# Altium footprint library CON.PcbLib: 36 footprints (part 1 of 3)
Each footprint in its own frame and in the unit in brackets; x right, y up, seen from the top. Pads: shape width x height; smd on the part's side, far side on the other; paste and mask are expansions set on the pad; w line width, h text height; cw(c..) or ccw(c..) is an arc to the next point about the centre after c.
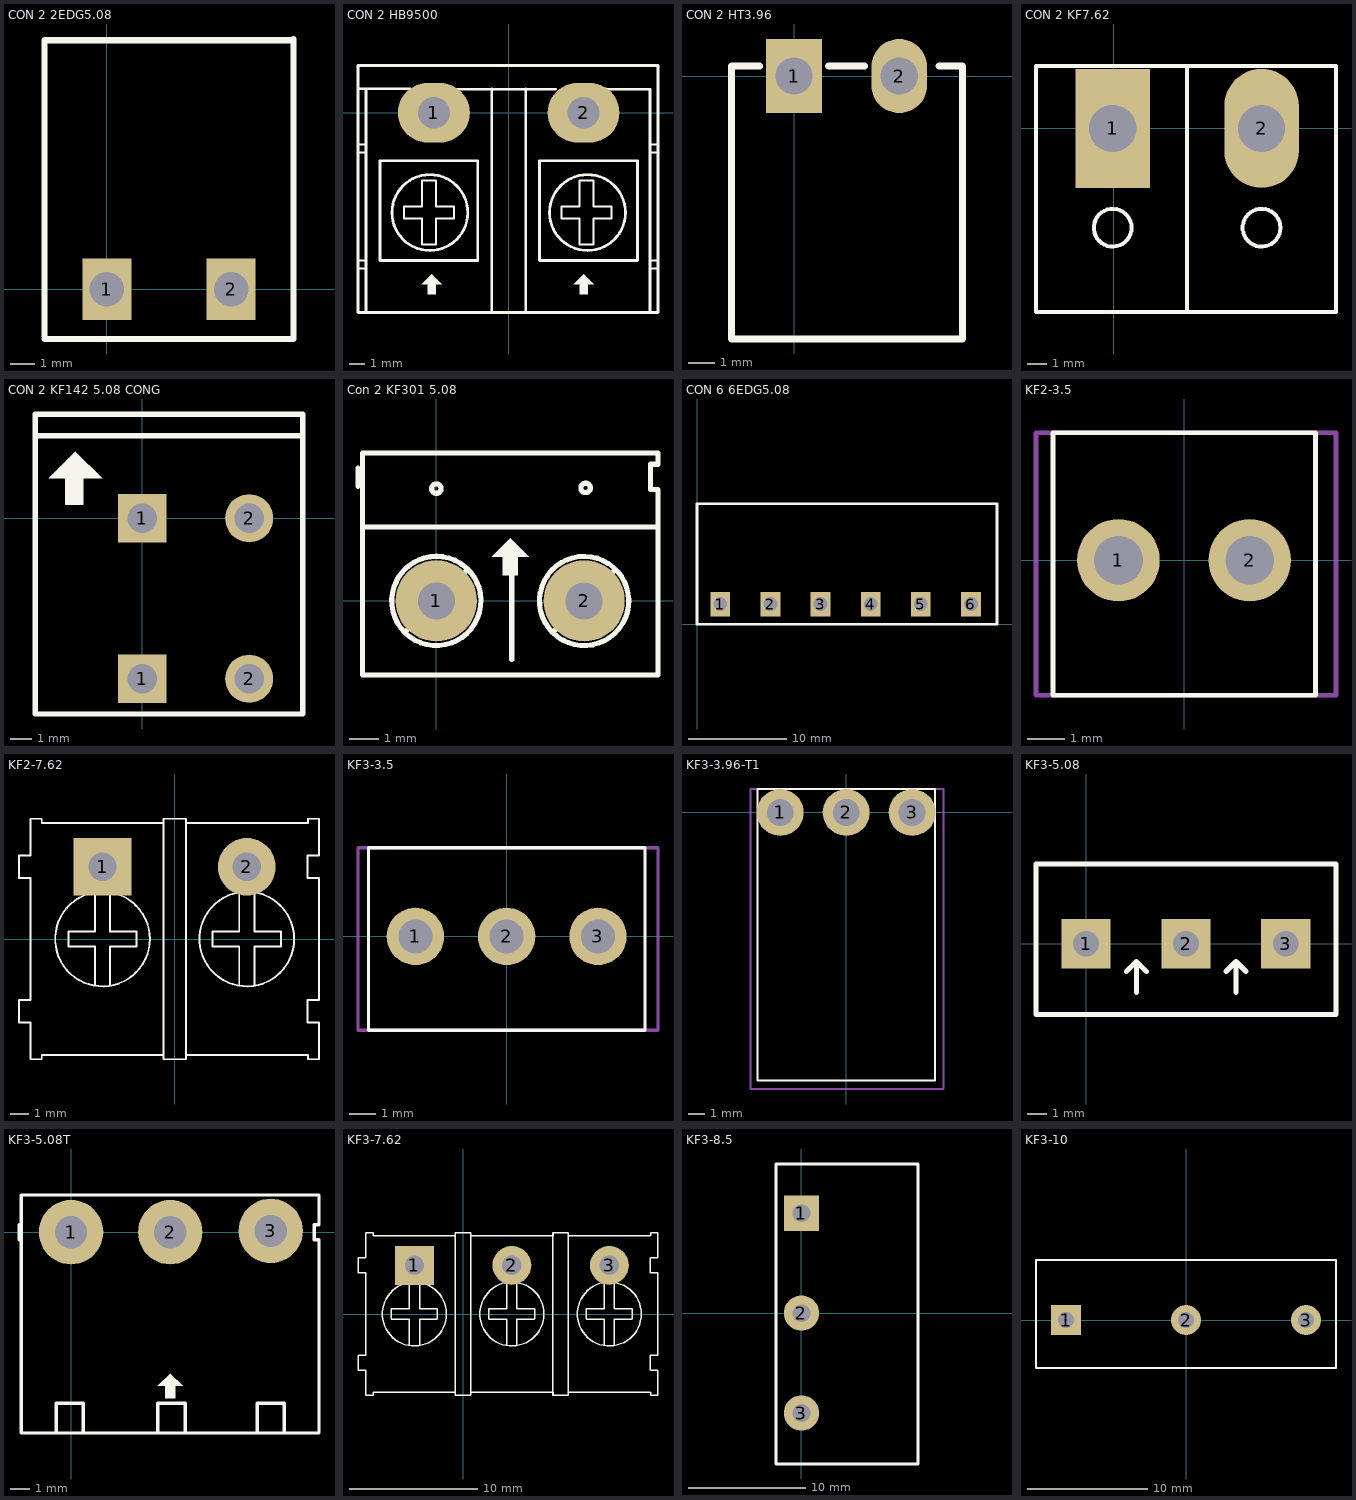
[diagram p0: the footprints below, top view; thin cyan lines are the x and y axes]

## CON 2 2EDG5.08 [mm]
pads (2):
  rect 2x2.5 hole 1.4: 1(0,0) 2(5.08,0)
Top Overlay:
  lines w0.254: -2.54,-2.032 7.62,-2.032 7.62,10.211 ; -2.54,-1.905 -2.54,10.173 ; -2.54,10.16 7.62,10.16
3D body "User Library-BigHeader 5EHDR_1P.step": height 3.15, standoff -9.32, extent -2.5,-1.75 2.5,10.25
3D body "User Library-BigHeader 5EHDR_1P.step": height 3.15, standoff -9.32, extent 2.58,-1.75 7.58,10.25

## CON 2 HB9500 [mil] "Header 2: 300V-20A, 2 pin, hight 300mil, Pin to Pin 400, Colour Green"
height 300
pads (2):
  oval 180x150 hole 80: 1(-187.5,0) 2(187.5,0)
Top Overlay:
  circle w7: c197.5,-250 r95
  circle w7: c-197.5,-250 r95
  region: 187.5,-405 162.5,-430 177.5,-430 177.5,-455 197.5,-455 197.5,-430 212.5,-430
  region: -192.5,-405 -217.5,-430 -202.5,-430 -202.5,-455 -182.5,-455 -182.5,-430 -167.5,-430
  lines w5: -375,-390 -360,-390 ; -375,-370 -360,-370 ; -375,-100 -360,-100 ; -375,-80 -360,-80 ; 355,-390 370,-390 ; 355,-370 370,-370 ; 355,-100 370,-100 ; 355,-80 370,-80 ; -262.5,-265 -262.5,-235 -217.5,-235 -217.5,-170 -182.5,-170 -182.5,-235 -137.5,-235 -137.5,-265 -182.5,-265 -182.5,-330 -217.5,-330 -217.5,-265 -262.5,-265 ; 132.5,-265 132.5,-235 177.5,-235 177.5,-170 212.5,-170 212.5,-235 257.5,-235 257.5,-265 212.5,-265 212.5,-330 177.5,-330 177.5,-265 132.5,-265
  lines w7: -377.5,60 -247.5,60 ; -357.5,-495 -357.5,60 ; -131.89,59.06 118.11,59.06 ; -42.5,-495 -42.5,60 ; 42.5,-495 42.5,60 ; 242.5,60 242.5,59.13 354.33,59.04 354.33,-495 ; -377.5,-500 -377.5,118.11 374.02,118.11 374.02,-500 -377.5,-500 ; -322.5,-370 -77.5,-370 -77.5,-120 -322.5,-120 -322.5,-370 ; 77.5,-370 322.5,-370 322.5,-120 77.5,-120 77.5,-370
3D body "CON 2 HB.stp": height 500.6, standoff -199.4, extent -366,-485 345,115

## CON 2 HT3.96 [mm]
pads (2):
  rect 2.1x2.794 hole 1.4: 1(0,0)
  oval 2.1x2.794 hole 1.4: 2(3.96,0)
Top Overlay:
  lines w0.254: -1.295,0.381 -2.286,0.381 -2.362,0.381 -2.362,-9.906 6.35,-9.906 6.35,0.381 5.461,0.381 ; 1.295,0.381 2.667,0.381
3D body "Con 2 KF396.stp": height 7.02, standoff 0.02, extent -1.968,-10 6.032,0

## CON 2 KF7.62 [mil]
pads (2):
  rect 150x240 hole 95: 1(-2,0)
  oval 150x240 hole 95: 2(298,0)
Top Overlay:
  circle w8: c298,-200 r38.08
  circle w8: c-2,-200 r38.08
  lines w7.87: 148,-368.06 148,126 ; -156.54,-370 448,-370 448,126 -156.54,126 -156.54,-339.27 -156.54,-370
3D body "Con 2 KF7.62.step": height 492.61, standoff -245.58, extent -152,-370 448,122.12

## CON 2 KF142 5.08 CONG [mil]
pads (4):
  rect 90x90 hole 55.12: 1(0,-300.39) 1(0,0)
  round 90 hole 55.12: 2(200,-300.39) 2(200,0)
Top Overlay:
  rectangle: -145,24.61 -110,74.61
  region: -175,74.61 -125,124.61 -75,74.61
  lines w10: -200,64.61 -200,154.61 ; -200,65.61 -200,-366.39 300,-366.39 ; 300,-365 300,195 ; 300,154.61 -200,154.61 ; 300,194.61 -200,194.61 -200,154.61
3D body "Terminal Blocks Fixed SPRING 2PIN CONG.stp": height 520.69, standoff -137.32, extent -205,-375.35 293.43,185.35

## Con 2 KF301 5.08 [mil]
pads (2):
  round 110 hole 50: 1(0,0) 2(200,0)
Top Overlay:
  circle w7: c202,153 r6.4
  circle w7: c0,152 r6.4
  region: 100,85 75,60 90,60 90,35 110,35 110,60 125,60
  lines w7: -106,155 -106,180 ; -100,100 300,100 ; -42,-42 43,43 ; 39.04,46.05 ccw(c0,0) 45.18,40.05 ; 102,-79 102,72 ; 158,-42 242.5,42.5 ; 239.76,45.44 ccw(c200,0) 245.18,40.05 ; 290,182 290,151 300,151 300,-100 -100,-100 -100,50 -100,200 300,200 300,185 290,185 ; 300,-79 300,40
3D body "Con 2 KF301.stp": height 335.25, standoff -137.19, extent -45,-97.4 255,190

## CON 6 6EDG5.08 [mm]
pads (6):
  rect 2x2.5 hole 1.4: 1(2.362,2.057) 2(7.442,2.057) 3(12.522,2.057) 4(17.602,2.057) 5(22.682,2.057) 6(27.762,2.057)
Top Overlay:
  lines w0.254: 16.205,12.217 30.404,12.217 30.404,0.025 30.302,0.025 20.142,0.025 9.982,0.025 0,0.025 0,12.217 20.142,12.217
3D body "User Library-BigHeader 5EHDR_1P.step": height 3.15, standoff -9.32, extent 25.262,0.308 30.262,12.308
3D body "User Library-BigHeader 5EHDR_1P.step": height 3.15, standoff -9.32, extent 20.182,0.308 25.182,12.308
3D body "User Library-BigHeader 5EHDR_1P.step": height 3.15, standoff -9.32, extent 15.102,0.308 20.102,12.308
3D body "User Library-BigHeader 5EHDR_1P.step": height 3.15, standoff -9.32, extent 10.022,0.308 15.022,12.308
3D body "User Library-BigHeader 5EHDR_1P.step": height 3.15, standoff -9.32, extent 4.942,0.308 9.942,12.308
3D body "User Library-BigHeader 5EHDR_1P.step": height 3.15, standoff -9.32, extent -0.138,0.308 4.862,12.308

## KF2-3.5 [mm] "3,50mm - modular - blue - Horizontal wire entry - Pressure clamp - 8,4mm height - 02p"
height 8.4
pads (2):
  round 2.2 hole 1.3: 1(-1.75,0) 2(1.75,0)
Top Overlay:
  lines w0.127: -3.5,-3.6 -3.5,3.4 3.5,3.4 3.5,-3.6 -3.5,-3.6
Mechanical 13:
  lines w0.127: -3.95,-3.6 4.05,-3.6 4.05,3.4 -3.95,3.4 -3.95,-3.6
3D body "691103110002.stp": height 8.41, standoff -3.79, extent -3.95,-3.6 4.05,3.4

## KF2-7.62 [mil]
pads (2):
  rect 120x120 hole 59.06 unplated: 1(-150,150)
  round 120 hole 59.06 unplated: 2(150,150)
Top Overlay:
  circle w4: c-150,0 r98.43
  circle w4: c150,0 r98.43
  lines w4: -323.62,-173.62 -323.62,-126.38 -300,-126.38 -300,126.38 -323.62,126.38 -323.62,173.62 ; -323,-173.62 -300,-173.62 -300,-250 -277,-250 ; -323,173.62 -300,173.62 -300,250 -277,250 ; -276.38,-250 -276.38,-241 -23.62,-241 -23.62,-250 23.62,-250 23.62,-241 276.38,-241 ; -276.38,250 -276.38,241 -23.62,241 -23.62,250 23.62,250 23.62,241 276.38,241 ; -221,-15.75 -165.75,-15.75 ; -221,-15 -221,16 ; -221,15.75 -165.75,15.75 ; -165.75,-97 -165.75,-16 ; -165.75,16 -165.75,97 ; -134.25,-97 -134.25,-16 ; -134.25,-15.75 -79,-15.75 ; -134.25,15.75 -79,15.75 ; -134.25,16 -134.25,97 ; -79,-15 -79,16 ; -23.62,-244 -23.62,245 ; 23.62,-244 23.62,245 ; 79,-15.75 134.25,-15.75 ; 79,-15 79,16 ; 79,15.75 134.25,15.75 ; 134.25,-97 134.25,-16 ; 134.25,16 134.25,97 ; 165.75,-97 165.75,-16 ; 165.75,-15.75 221,-15.75 ; 165.75,15.75 221,15.75 ; 165.75,16 165.75,97 ; 221,-15 221,16 ; 276.38,-173.62 276.38,-126.38 300,-126.38 300,126.38 276.38,126.38 276.38,173.62 ; 277,-241 277,-250 300,-250 300,-173.62 277,-173.62 ; 277,173.62 300,173.62 300,250 277,250 277,241
3D body "691313410002.stp": height 336.61, standoff -155.51, extent -300,-241.22 300,231.22

## KF3-3.5 [mm] "3,50mm - modular - blue - Horizontal wire entry - Pressure clamp - 8,4mm height - 03p"
height 8.4
pads (3):
  round 2.2 hole 1.3: 1(-3.5,0) 2(0,0) 3(3.5,0)
Top Overlay:
  lines w0.127: -5.3,-3.6 -5.3,3.4 5.3,3.4 5.3,-3.6 -5.3,-3.6
Mechanical 13:
  lines w0.127: -5.7,-3.6 -5.7,3.4 5.8,3.4 5.8,-3.6 -5.7,-3.6
3D body "691103110003.stp": height 8.41, standoff -3.79, extent -5.7,-3.6 5.8,3.4

## KF3-3.96-T1 [mm] "3,96mm - modular - blue - Horizontal wire entry - Pressure clamp - 10mm height - 03p"
height 10
pads (3):
  round 2.8 hole 1.6: 1(-3.937,0) 2(0,0) 3(3.937,0)
Top Overlay:
  lines w0.127: -5.3,-16.002 -5.3,1.397 5.3,1.397 5.3,-16.002 -5.3,-16.002
Mechanical 13:
  lines w0.127: -5.7,-16.51 -5.7,1.397 5.8,1.397 5.8,-16.51 -5.7,-16.51

## KF3-5.08 [mm]
pads (3):
  rect 2.5x2.5 hole 1.3: 1(0,0) 2(5.08,0) 3(10.147,0)
Top Overlay:
  lines w0.254: 2.045,-1.41 2.553,-0.902 ; 2.553,-2.464 2.553,-0.902 ; 3.061,-1.41 2.553,-0.902 ; 7.112,-1.41 7.62,-0.902 ; 7.62,-2.464 7.62,-0.902 ; 8.128,-1.41 7.62,-0.902 ; -2.54,-3.581 12.7,-3.581 12.7,4.064 -2.54,4.064 -2.54,-3.581
3D body "SW3DPS-HDR1x3-MED-GREEN.STEP": height 10, standoff -4, extent -2.42,-3.505 12.58,3.995

## KF3-5.08T [mil] "Header 3, 3 pin, hight 300mil, Pin to Pin 200, Colour Green"
height 300
pads (3):
  round 130 hole 65: 1(0,0) 2(200,0) 3(402.62,2.62)
Top Overlay:
  region: 200,-285 175,-310 190,-310 190,-335 210,-335 210,-310 225,-310
  lines w7: -105,-15 -105,15 ; -30,-400 -30,-345 25,-345 25,-400 ; 175,-400 175,-345 230,-345 230,-400 ; 375,-400 375,-345 430,-345 430,-400 ; -100,-405 -100,75 500,75 500,15 490,15 490,-15 500,-15 500,-405 -100,-405
3D body "User Library-BigHeader 5EHDR_1P.step": height 124.02, standoff -366.97, extent 299,-404.22 495.85,68.22
3D body "User Library-BigHeader 5EHDR_1P.step": height 124.02, standoff -366.97, extent 102,-404 298.85,68.44
3D body "User Library-BigHeader 5EHDR_1P.step": height 124.02, standoff -366.97, extent -95,-404 101.85,68.44

## KF3-7.62 [mil]
pads (3):
  rect 120x120 hole 59.06 unplated: 1(-150,150)
  round 120 hole 59.06 unplated: 2(150,150) 3(450,150)
Top Overlay:
  circle w4: c150,0 r98.43
  circle w4: c-150,0 r98.43
  circle w4: c450,0 r98.43
  lines w4: -323.62,-173.62 -323.62,-126.38 -300,-126.38 -300,126.38 -323.62,126.38 -323.62,173.62 ; -323,-173.62 -300,-173.62 -300,-250 -277,-250 ; -323,173.62 -300,173.62 -300,250 -277,250 ; -276.38,-250 -276.38,-241 -23.62,-241 -23.62,-250 23.62,-250 23.62,-241 276.38,-241 276.38,-250 323.62,-250 323.62,-241 576.38,-241 ; -276.38,250 -276.38,241 -23.62,241 -23.62,250 23.62,250 23.62,241 276.38,241 276.38,250 323.62,250 323.62,241 576.38,241 ; -221,-15.75 -165.75,-15.75 ; -221,-15 -221,16 ; -221,15.75 -165.75,15.75 ; -165.75,-97 -165.75,-16 ; -165.75,16 -165.75,97 ; -134.25,-97 -134.25,-16 ; -134.25,-15.75 -79,-15.75 ; -134.25,15.75 -79,15.75 ; -134.25,16 -134.25,97 ; -79,-15 -79,16 ; -23.62,-244 -23.62,245 ; 23.62,-244 23.62,245 ; 79,-15.75 134.25,-15.75 ; 79,-15 79,16 ; 79,15.75 134.25,15.75 ; 134.25,-97 134.25,-16 ; 134.25,16 134.25,97 ; 165.75,-97 165.75,-16 ; 165.75,-15.75 221,-15.75 ; 165.75,15.75 221,15.75 ; 165.75,16 165.75,97 ; 221,-15 221,16 ; 276.38,-244 276.38,245 ; 276.38,-173.62 276.38,-126.38 ; 276.38,126.38 276.38,173.62 ; 277,-241 277,-250 300,-250 ; 277,241 277,250 300,250 ; 323.62,-244 323.62,245 ; 379,-15.75 434.25,-15.75 ; 379,-15 379,16 ; 379,15.75 434.25,15.75 ; 434.25,-97 434.25,-16 ; 434.25,16 434.25,97 ; 465.75,-97 465.75,-16 ; 465.75,-15.75 521,-15.75 ; 465.75,15.75 521,15.75 ; 465.75,16 465.75,97 ; 521,-15 521,16 ; 576.38,-173.62 576.38,-126.38 600,-126.38 600,126.38 576.38,126.38 576.38,173.62 ; 577,-241 577,-250 600,-250 600,-173.62 577,-173.62 ; 577,173.62 600,173.62 600,250 577,250 577,241
3D body "691313410003.stp": height 336.61, standoff -155.51, extent -300.01,-241.23 599.99,231.22

## KF3-8.5 [mm]
pads (3):
  rect 3x3 hole 1.5: 1(0,8.509)
  round 3 hole 1.5: 2(0,0.009) 3(0,-8.491)
Top Overlay:
  lines w0.254: -2.159,-12.827 9.906,-12.827 9.906,12.7 -2.159,12.7 -2.159,-12.827
3D body "User Library-KF8500-3P.STEP": height 12.5, standoff -3.75, extent -2.159,-12.75 9.841,12.75

## KF3-10 [mm] "Serie 1368 - 10.00 mm _ 3 pins"
height 13
pads (3):
  rect 2.5x2.5 hole 1.3: 1(-10,0)
  round 2.5 hole 1.3: 2(0,0) 3(10,0)
Top Overlay:
  lines w0.2: -12.5,-4 -12.5,5 12.5,5 12.5,-4 -12.5,-4
3D body "691136810003.stp": height 13.1, standoff -3.9, extent -12.5,-4 12.5,5